# Altium footprint library mastermind.PCBLIB: 1061 footprints (part 64 of 67)
Each footprint in its own frame and in the unit in brackets; x right, y up, seen from the top. Pads: shape width x height; smd on the part's side, far side on the other; paste and mask are expansions set on the pad; w line width, h text height; cw(c..) or ccw(c..) is an arc to the next point about the centre after c.
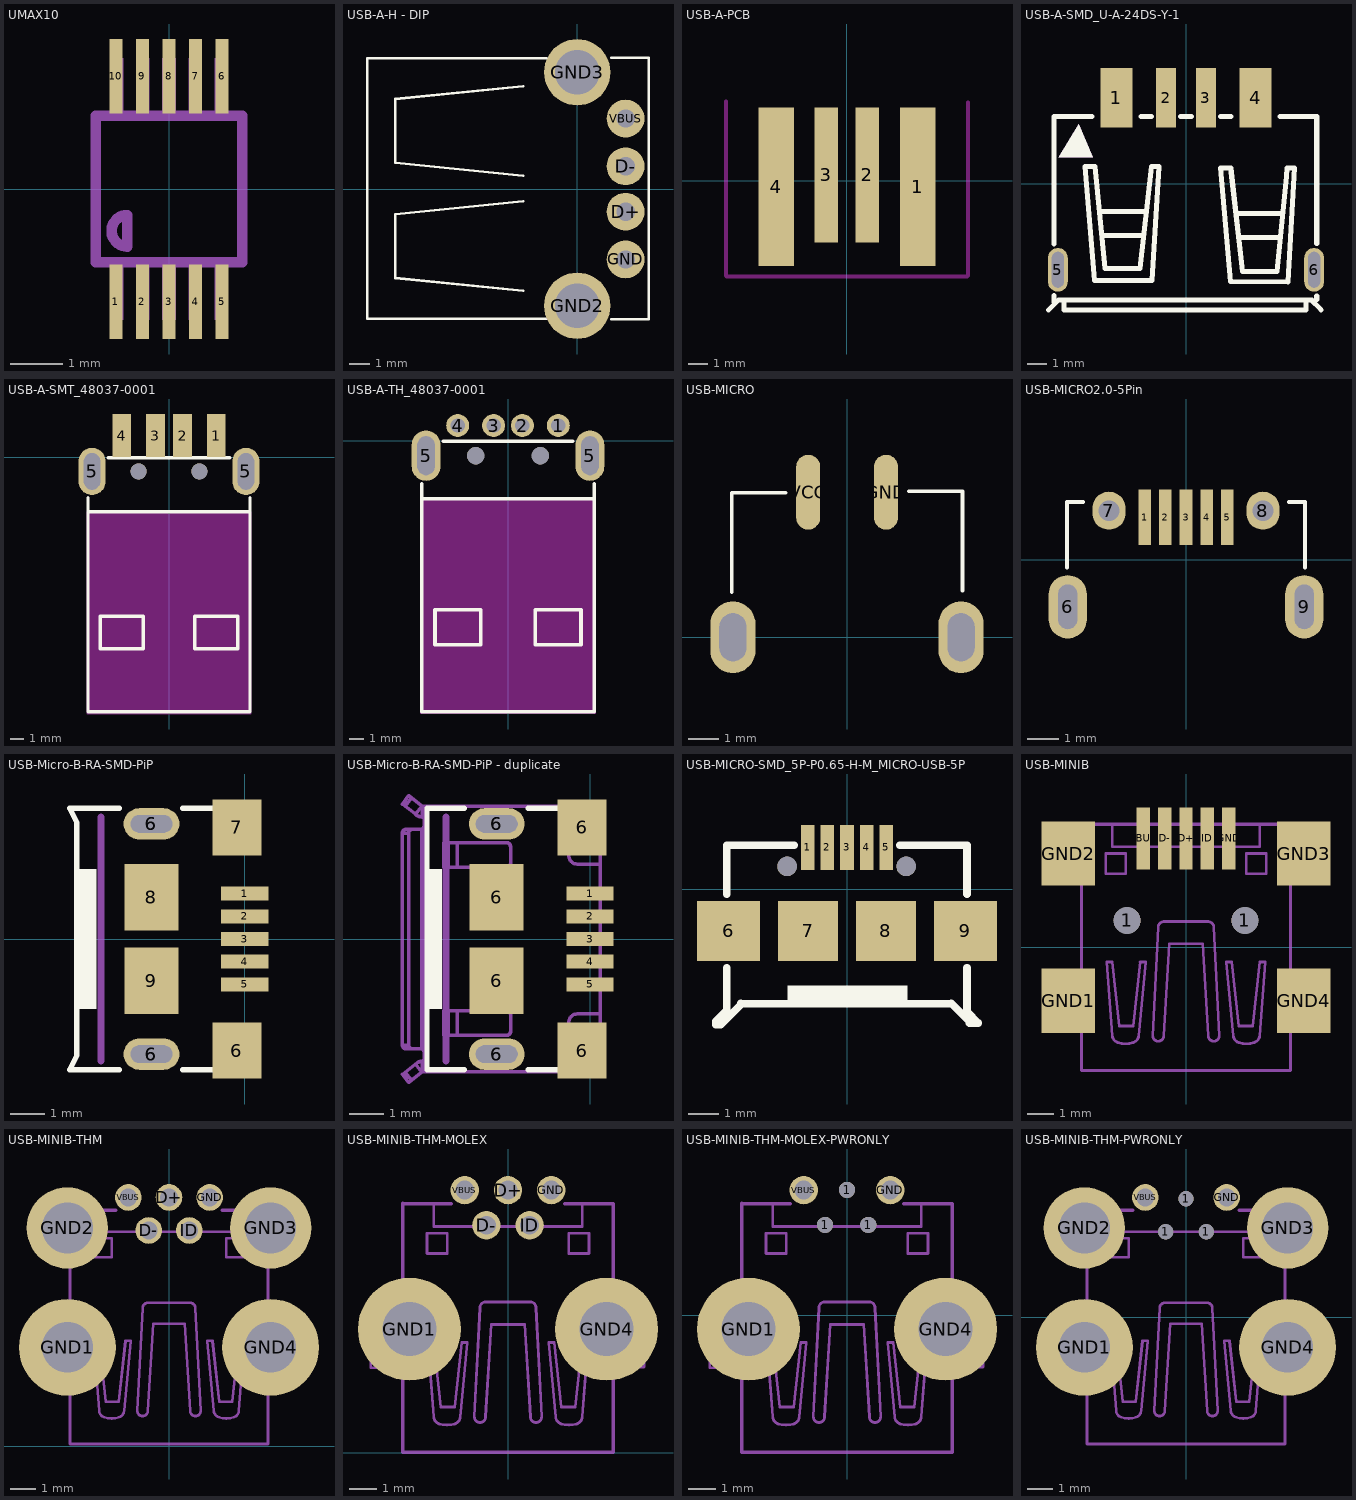
[diagram p63: the footprints below, top view; thin cyan lines are the x and y axes]

## UMAX10 [mil]
pads (10):
  rect 10x56 smd: 1(-40,-85) 2(-20,-85) 3(0,-85) 4(20,-85) 5(40,-85) 6(40,85) 7(20,85) 8(0,85) 9(-20,85) 10(-40,85)
Mechanical 2:
  lines w8: -55.12,-55.12 -55.12,55.12 55.12,55.12 55.12,-55.12 -55.12,-55.12 ; -31.5,-43.31 cw(c-31.5,-31.5) -31.5,-19.69 -31.5,-43.31
Mechanical 8:
  region: -34.47,98.43 -34.47,59.06 -44.32,59.06 -44.32,98.43
  region: -14.79,98.43 -14.79,59.06 -24.63,59.06 -24.63,98.43
  region: 4.9,98.43 4.9,59.06 -4.94,59.06 -4.94,98.43
  region: 24.58,98.43 24.58,59.06 14.74,59.06 14.74,98.43
  region: 44.27,98.43 44.27,59.06 34.43,59.06 34.43,98.43
  region: 34.47,-98.43 34.47,-59.06 44.32,-59.06 44.32,-98.43
  region: 14.79,-98.43 14.79,-59.06 24.63,-59.06 24.63,-98.43
  region: -4.9,-98.43 -4.9,-59.06 4.94,-59.06 4.94,-98.43
  region: -24.58,-98.43 -24.58,-59.06 -14.74,-59.06 -14.74,-98.43
  region: -44.27,-98.43 -44.27,-59.06 -34.43,-59.06 -34.43,-98.43

## USB-A-H - DIP [mil]
pads (6):
  round 74 hole 36: D+(94.49,-44.37) D-(94.49,44.37) GND(94.49,-137.8) VBUS(94.49,137.8)
  round 129.91 hole 86.61: GND2(0,-228.35) GND3(0,228.35)
Top Overlay:
  lines w5: -106,-199 -356,-174 -356,-49 -106,-24 ; -106,26 -356,51 -356,176 -106,201 ; -60,-254 -411,-254 -411,256 -60,256 ; 66,-255 140,-255 140,257 66,257

## USB-A-PCB [mm]
pads (4):
  rect 1.8x8 smd: 1(3.567,-0.3) 4(-3.567,-0.3)
  rect 1.2x6.8 smd: 2(1.027,0.3) 3(-1.046,0.3)
Keep-Out Layer:
  lines w0.2: -6.108,-4.766 -6.108,3.994 ; -6.068,-4.816 6.047,-4.816 ; 6.097,-4.776 6.097,3.955

## USB-A-SMD_U-A-24DS-Y-1 [mm]
pads (6):
  rect 1.6x3 smd paste-100 mask+0.051: 1(-3.5,4.325) 4(3.5,4.325)
  rect 1x3 smd paste-100 mask+0.051: 2(-1,4.325) 3(1,4.325)
  oval 1x2.2 hole 0.6 slot 1.8 at 90 deg paste-2539.97 mask+0.051: 5(-6.45,-4.325) 6(6.45,-4.325)
Top Overlay:
  region: -5.39,3.01 -6.41,1.34 -4.69,1.33
  lines w0.254: -6.914,-6.343 -6.406,-5.835 ; -6.65,-5.95 -6.65,-5.628 ; -6.65,-3.022 -6.65,3.4 -4.732,3.4 ; -6.35,-5.835 6.35,-5.835 ; -6.152,-5.835 -6.152,-6.343 6.04,-6.343 6.04,-5.835 ; -4.305,-1.39 -2.045,-1.39 ; -4.165,-2.6 -2.135,-2.6 ; -2.268,3.4 -1.732,3.4 ; -0.269,3.4 0.269,3.4 ; 1.732,3.4 2.268,3.4 ; 2.576,-1.489 4.836,-1.489 ; 2.716,-2.699 4.746,-2.699 ; 4.732,3.4 6.58,3.4 6.58,-3.006 ; 6.294,-5.835 6.802,-6.343 ; 6.58,-5.82 6.58,-5.644 ; -5.091,0.875 -4.583,0.875 -4.077,-4.26 -2.327,-4.26 -1.738,0.875 -1.357,0.875 -1.712,-4.865 -4.608,-4.865 -5.091,0.875 ; 1.744,0.809 2.253,0.806 2.763,-3.735 2.838,-4.413 4.588,-4.402 5.062,0.376 5.092,0.806 5.472,0.806 5.124,-4.93 2.239,-4.926 1.744,0.809
Top Paste:
  region: 2.499,2.824 2.499,5.826 4.501,5.826 4.501,2.824
  region: 0.5,2.824 0.5,5.826 1.501,5.826 1.501,2.824
  region: -1.501,2.824 -1.501,5.826 -0.5,5.826 -0.5,2.824
  region: -4.501,2.824 -4.501,5.826 -2.499,5.826 -2.499,2.824
  region: -5.95,-4.925 -5.95,-5.024 -6.026,-5.208 -6.167,-5.349 -6.351,-5.425 -6.549,-5.425 -6.733,-5.349 -6.874,-5.208 -6.95,-5.024 -6.95,-4.925 -6.95,-3.725 -6.95,-3.626 -6.874,-3.442 -6.733,-3.301 -6.549,-3.225 -6.351,-3.225 -6.167,-3.301 -6.026,-3.442 -5.95,-3.626 -5.95,-3.725
  region: 6.95,-4.925 6.95,-5.024 6.874,-5.208 6.733,-5.349 6.55,-5.425 6.351,-5.425 6.167,-5.349 6.026,-5.208 5.95,-5.024 5.95,-4.925 5.95,-3.725 5.95,-3.626 6.026,-3.442 6.167,-3.301 6.351,-3.225 6.55,-3.225 6.733,-3.301 6.874,-3.442 6.95,-3.626 6.95,-3.725
Mechanical 15:
  region: -5.39,3.01 -6.41,1.34 -4.69,1.33
3D body "Unnamed-PCBModel.step": height 6.4, standoff -2.3, extent -6.642,-7.175 6.459,4.325

## USB-A-SMT_48037-0001 [mm]
pads (8):
  rect 1.4x3.2 smd: 1(3.5,1.6) 2(1,1.6) 3(-1,1.6) 4(-3.5,1.6)
  oval 2x3.5 hole 1.2 slot 2.7 at 90 deg: 5(-5.7,-1.05) 5(5.7,-1.05)
  round 1.2 hole 1.2 unplated: ""(-2.25,-1.05) ""(2.25,-1.05)
Top Overlay:
  lines w0.254: -6,-4.05 6,-4.05 ; -6,-2.994 -6,-18.85 6,-18.85 6,-2.994 ; -4.495,-0.05 4.495,-0.05 ; -5.08,-14.19 -5.08,-11.777 -1.905,-11.777 -1.905,-14.19 -5.08,-14.19 ; 1.905,-14.19 1.905,-11.777 5.08,-11.777 5.08,-14.19 1.905,-14.19
Keep-Out Layer:
  board cut-out: -6.096,-4.03 6.096,-4.03 6.096,-19.016 -6.096,-19.016
3D body "USB Connector Type A male, SMT.STEP": height 4.45, standoff -2.55, extent -6.214,-19.016 6.214,2.486

## USB-A-TH_48037-0001 [mm]
pads (8):
  round 1.6 hole 1: 1(3.5,1.05) 2(1,1.05) 3(-1,1.05) 4(-3.5,1.05)
  oval 2x3.5 hole 1.2 slot 2.7 at 90 deg: 5(-5.7,-1.05) 5(5.7,-1.05)
  round 1.2 hole 1.2 unplated: ""(-2.25,-1.05) ""(2.25,-1.05)
Top Overlay:
  lines w0.254: -6,-4.05 6,-4.05 ; -6,-2.994 -6,-18.85 6,-18.85 6,-2.994 ; -4.495,-0.05 4.495,-0.05 ; -5.08,-14.19 -1.905,-14.19 -1.905,-11.777 -5.08,-11.777 -5.08,-14.19 ; 1.905,-14.19 5.08,-14.19 5.08,-11.777 1.905,-11.777 1.905,-14.19
Keep-Out Layer:
  board cut-out: -6.096,-4.03 6.096,-4.03 6.096,-19.016 -6.096,-19.016
3D body "usbA.stp": height 4.5, standoff -1.39, extent -6.37,-19.02 6.33,1.18

## USB-MICRO [mm]
pads (4):
  oval 0.8x2.5 smd: GND(1.3,4.84) VCC(-1.3,4.84)
  oval 1.5x2.4 hole 0.9 slot 1.6 at 90 deg: ""(-3.81,0) ""(3.8,0)
Top Overlay:
  lines w0.12: -3.85,1.5 -3.85,4.825 -2.05,4.825 ; 2.05,4.875 3.85,4.875 3.85,1.55

## USB-MICRO2.0-5Pin [mm]
pads (9):
  rect 0.4x1.75 smd: 1(-1.3,1.337) 2(-0.65,1.337) 3(0,1.337) 4(0.65,1.337) 5(1.3,1.337)
  oval 1.2x2 hole 0.6 slot 1.4 at 90 deg: 6(-3.725,-1.488) 9(3.725,-1.488)
  oval 1.05x1.2 hole 0.65: 7(-2.426,1.542) 8(2.425,1.542)
Top Overlay:
  lines w0.127: -3.75,-0.254 -3.75,1.812 -3.25,1.812 ; 3.25,1.812 3.75,1.812 3.75,-0.254
3D body "micro_usb_connector.stp": height 2.6, standoff -0.8, extent -3.891,-3.874 3.881,1.969

## USB-Micro-B-RA-SMD-PiP [mm]
pads (13):
  rect 1.35x0.4 smd: 1(0,1.3) 2(0,0.65) 3(0,0) 4(0,-0.65) 5(0,-1.3)
  oval 1.6x0.9 hole 0.5 slot 1.2 at 0 deg: 6(-2.675,-3.3) 6(-2.675,3.3)
  oval 2x1.5 on Top Paste: 6(-2.675,-3.3) 6(-2.675,3.3)
  rect 1.4x1.6 smd: 6(-0.225,-3.2) 7(-0.225,3.2)
  rect 1.55x1.9 smd: 8(-2.675,1.2) 9(-2.675,-1.2)
Top Overlay:
  rectangle: -4.75,-2 -4.25,2
  lines w0.152: -3.6,-3.75 -5.021,-3.75 -4.814,-3.329 -4.814,3.329 -5.021,3.75 -3.6,3.75 ; -1.775,-3.75 0.25,-3.75 0.25,-3.275 ; -1.775,3.75 0.25,3.75 0.25,3.275
Mechanical 15:
  lines w0.2: -4.125,-3.5 -4.125,3.5
3D body "User Library-MicroUSB-B_Molex_105017-0001.step": height 2.72, standoff -0.59, extent -5.28,-4.1 0.15,4.1

## USB-Micro-B-RA-SMD-PiP - duplicate [mm] "Micro USB B SMT"
height 3
pads (13):
  rect 1.35x0.4 smd: 1(0,1.3) 2(0,0.65) 3(0,0) 4(0,-0.65) 5(0,-1.3)
  oval 1.6x0.9 hole 0.5 slot 1.2 at 0 deg: 6(-2.675,-3.3) 6(-2.675,3.3)
  oval 2x1.5 on Top Paste: 6(-2.675,-3.3) 6(-2.675,3.3)
  rect 1.55x1.9 smd: 6(-2.675,-1.2) 6(-2.675,1.2)
  rect 1.4x1.6 smd: 6(-0.225,-3.2) 6(-0.225,3.2)
Top Overlay:
  rectangle: -4.75,-2 -4.25,2
  lines w0.152: -3.6,-3.75 -4.675,-3.75 -4.675,3.75 -3.6,3.75 ; -1.775,-3.75 0.25,-3.75 0.25,-3.275 ; -1.775,3.75 0.25,3.75 0.25,3.275
Dimensions:
  drawing of 2738 lines, arcs and shapes, not listed
  text ".Designator" at -2.616,-0.297 h0.38
Mechanical 15:
  lines w0.2: -4.125,-3.5 -4.125,3.5
3D body "User Library-MicroUSB-B_Molex_105017-0001.step": height 2.72, standoff -0.59, extent -5.28,-4.1 0.15,4.1

## USB-MICRO-SMD_5P-P0.65-H-M_MICRO-USB-5P [mm]
pads (11):
  rect 0.45x1.5 smd: 1(-1.3,1.392) 2(-0.65,1.392) 3(0,1.392) 4(0.65,1.392) 5(1.3,1.392)
  rect 2.1x2 smd: 6(-3.95,-1.392) 9(3.95,-1.392)
  rect 2x2 smd: 7(-1.3,-1.392) 8(1.3,-1.392)
  round 0.65 hole 0.65 unplated mask+0: ""(-1.995,0.756)
  round 0.65 hole 0.65 unplated paste-2539.97 mask+0: ""(1.974,0.756)
Top Overlay:
  region: 2.016,-3.718 2.016,-3.218 -1.984,-3.218 -1.984,-3.718
  lines w0.254: -4.011,-2.624 -4.011,-4.044 -4.369,-4.402 -4.369,-4.514 -4.204,-4.514 -3.54,-3.85 -3.54,-3.803 ; -4.011,-0.161 -4.011,1.468 ; -4,1.458 -1.757,1.458 ; -3.54,-3.82 3.475,-3.82 ; 1.757,1.458 4,1.458 4,-0.161 ; 3.475,-3.803 4.084,-4.412 4.084,-4.463 4.376,-4.463 4,-4.087 4,-4.044 4,-2.624
3D body "micro USB.STEP": height 2.93, standoff 0.01, extent -4.011,-3.958 3.963,1.468

## USB-MINIB [mm]
pads (11):
  round 1 hole 1: 1(-2.2,1) 1(2.2,1)
  rect 0.5x2.308 smd: D+(0,4.064) D-(-0.8,4.064) GND(1.6,4.064) ID(0.8,4.064) VBUS(-1.6,4.064)
  rect 2x2.4 smd: GND1(-4.4,-2) GND2(-4.4,3.5) GND3(4.4,3.5) GND4(4.4,-2)
Mechanical 2:
  lines w0.127: -3.9,-4.6 3.9,-4.6 ; -3.9,-0.6 -3.9,2.1 ; -3.9,4.6 3.9,4.6 ; -3.2,4.6 -2.1,4.6 ; 2.1,4.6 3.2,4.6 ; 3.9,-0.6 3.9,2.1
Mechanical 8:
  lines w0.102: -5.08,-2.67 -5.08,-2.32 ccw(c-5.08,-2.02) -5.08,-1.72 -5.08,-1.32 ; -5.08,2.87 -5.08,3.22 ccw(c-5.08,3.52) -5.08,3.82 -5.08,4.22 ; -5.06,-2.679 -3.91,-2.679 ; -5.06,-1.301 -3.91,-1.301 ; -5.06,2.861 -3.91,2.861 ; -5.06,4.239 -3.91,4.239 ; -2.75,4.5 -2.75,3.75 2.75,3.75 2.75,4.5 ; -1.038,-3.506 cw(c-1.038,-3.299) -1.246,-3.298 -1.038,0.751 cw(c-0.819,0.739) -0.831,0.958 0.83,0.958 cw(c0.818,0.739) 1.038,0.751 1.246,-3.298 cw(c1.038,-3.299) 1.038,-3.506 cw(c1.038,-3.298) 0.83,-3.298 0.623,0.128 -0.623,0.128 -0.831,-3.298 cw(c-1.038,-3.299) -1.038,-3.506 ; 3.88,-2.659 5.03,-2.659 ; 3.88,-1.281 5.03,-1.281 ; 3.88,2.881 5.03,2.881 ; 3.88,4.259 5.03,4.259 ; 5.05,-2.64 5.05,-2.24 cw(c5.05,-1.94) 5.05,-1.64 5.05,-1.29 ; 5.05,2.9 5.05,3.3 cw(c5.05,3.6) 5.05,3.9 5.05,4.25 ; -3,2.75 -2.25,2.75 -2.25,3.5 -3,3.5 -3,2.75 ; -2.959,-0.547 -2.751,-3.298 ccw(c-2.457,-3.276) -2.544,-3.558 ccw(c-2.258,-2.627) -1.973,-3.558 ccw(c-2.059,-3.276) -1.765,-3.298 -1.505,-0.547 -1.713,-0.547 -1.973,-2.935 -2.492,-2.935 -2.751,-0.547 -2.959,-0.547 ; 1.505,-0.547 1.765,-3.298 ccw(c2.059,-3.276) 1.973,-3.558 ccw(c2.258,-2.627) 2.544,-3.558 ccw(c2.457,-3.276) 2.751,-3.298 2.959,-0.547 2.751,-0.547 2.492,-2.935 1.973,-2.935 1.713,-0.547 1.505,-0.547 ; 2.25,2.75 2.25,3.5 3,3.5 3,2.75 2.25,2.75
  lines w0.127: -3.9,-4.6 -3.9,-2.7 ; -3.9,-1.29 -3.9,2.81 ; -3.9,4.25 -3.9,4.6 ; 3.9,-4.6 3.9,-2.7 ; 3.9,-1.24 3.9,2.86 ; 3.9,4.3 3.9,4.6

## USB-MINIB-THM [mm]
pads (9):
  round 1.05 hole 0.7: D+(0,9.8) D-(-0.8,8.5) GND(1.6,9.8) ID(0.8,8.5) VBUS(-1.6,9.8)
  round 3.81 hole 2: GND1(-4,3.9) GND4(4,3.9)
  round 3.2 hole 2: GND2(-4,8.6) GND3(4,8.6)
Mechanical 2:
  lines w0.102: -1.038,1.194 -1.038,1.194
  lines w0.127: -3.9,0.1 3.9,0.1 ; -3.9,4.1 -3.9,6.8 ; -3.2,9.3 -2.1,9.3 ; 2.1,9.3 3.2,9.3 ; 3.9,4.7 3.9,6.8
Mechanical 8:
  lines w0.102: -5.08,3.23 -5.08,3.58 ccw(c-5.08,3.88) -5.08,4.18 -5.08,4.58 ; -5.08,7.57 -5.08,7.92 ccw(c-5.08,8.22) -5.08,8.52 -5.08,8.92 ; -5.06,3.221 -3.91,3.221 ; -5.06,4.599 -3.91,4.599 ; -5.06,7.561 -3.91,7.561 ; -5.06,8.939 -3.91,8.939 ; -2.75,9.2 -2.75,8.45 2.75,8.45 2.75,9.2 ; -1.038,1.194 cw(c-1.038,1.401) -1.246,1.402 -1.038,5.451 cw(c-0.819,5.439) -0.831,5.658 0.83,5.658 cw(c0.818,5.439) 1.038,5.451 1.246,1.402 cw(c1.038,1.401) 1.038,1.194 cw(c1.038,1.402) 0.83,1.402 0.623,4.828 -0.623,4.828 -0.831,1.402 cw(c-1.038,1.401) -1.038,1.194 ; 3.88,3.241 5.03,3.241 ; 3.88,4.619 5.03,4.619 ; 3.88,7.581 5.03,7.581 ; 3.88,8.959 5.03,8.959 ; 5.05,3.26 5.05,3.66 cw(c5.05,3.96) 5.05,4.26 5.05,4.61 ; 5.05,7.6 5.05,8 cw(c5.05,8.3) 5.05,8.6 5.05,8.95 ; -3,7.45 -2.25,7.45 -2.25,8.2 -3,8.2 -3,7.45 ; -2.959,4.153 -2.751,1.402 ccw(c-2.457,1.424) -2.544,1.142 ccw(c-2.258,2.073) -1.973,1.142 ccw(c-2.059,1.424) -1.765,1.402 -1.505,4.153 -1.713,4.153 -1.973,1.765 -2.492,1.765 -2.751,4.153 -2.959,4.153 ; 1.505,4.153 1.765,1.402 ccw(c2.059,1.424) 1.973,1.142 ccw(c2.258,2.073) 2.544,1.142 ccw(c2.457,1.424) 2.751,1.402 2.959,4.153 2.751,4.153 2.492,1.765 1.973,1.765 1.713,4.153 1.505,4.153 ; 2.25,7.45 2.25,8.2 3,8.2 3,7.45 2.25,7.45
  lines w0.127: -3.9,0.1 -3.9,3.2 ; -3.9,4.61 -3.9,7.51 ; -3.9,8.95 -3.9,9.3 ; 3.9,0.1 3.9,3.2 ; 3.9,4.66 3.9,7.56 ; 3.9,9 3.9,9.3

## USB-MINIB-THM-MOLEX [mil]
pads (7):
  round 41.34 hole 27.56: D+(0,382.68) D-(-31.5,331.5) GND(62.99,382.68) ID(31.5,331.5) VBUS(-62.99,382.68)
  round 150 hole 78.74: GND1(-143.7,179.92) GND4(143.7,179.92)
Mechanical 2:
  lines w4: -40.88,43.85 -40.87,43.85
  lines w5: -153.54,0.79 153.54,0.79 ; -153.54,158.27 -153.54,264.57 ; -153.54,362.99 -82.68,362.99 ; 82.68,362.99 153.54,362.99 ; 153.54,181.89 153.54,264.57
Mechanical 8:
  lines w4: -200,124.02 -200,137.8 ccw(c-200,149.61) -200,161.42 -200,177.17 ; -199.21,123.65 -153.94,123.65 ; -199.21,177.92 -153.94,177.92 ; -108.27,359.06 -108.27,329.53 108.27,329.53 108.27,359.06 ; -40.88,43.85 cw(c-40.88,52.02) -49.05,52.03 -40.88,211.45 cw(c-32.23,210.97) -32.7,219.62 32.69,219.62 cw(c32.22,210.97) 40.87,211.45 49.04,52.03 cw(c40.87,52.02) 40.87,43.85 cw(c40.87,52.03) 32.69,52.03 24.52,186.92 -24.54,186.92 -32.7,52.03 cw(c-40.88,52.02) -40.87,43.85 ; 152.76,124.44 198.03,124.44 ; 152.76,178.72 198.03,178.72 ; 198.82,125.2 198.82,140.94 cw(c198.82,152.75) 198.82,164.57 198.82,178.35 ; -118.11,290.16 -118.11,319.69 -88.58,319.69 -88.58,290.16 -118.11,290.16 ; -116.5,160.35 -108.32,160.35 -98.11,66.33 -77.67,66.33 -67.45,160.35 -59.27,160.35 -69.49,52.03 cw(c-81.07,52.91) -77.67,41.81 cw(c-88.91,78.46) -100.15,41.81 cw(c-96.75,52.91) -108.32,52.03 -116.5,160.35 ; 59.26,160.35 67.44,160.35 77.66,66.33 98.1,66.33 108.32,160.35 116.49,160.35 108.32,52.03 cw(c96.74,52.91) 100.14,41.81 cw(c88.9,78.46) 77.66,41.81 cw(c81.06,52.91) 69.48,52.03 59.26,160.35 ; 88.58,290.16 118.11,290.16 118.11,319.69 88.58,319.69 88.58,290.16
  lines w5: -153.54,0.79 -153.54,122.83 ; -153.54,178.35 -153.54,363.39 ; 153.54,0.79 153.54,122.83 ; 153.54,180.32 153.54,361.42

## USB-MINIB-THM-MOLEX-PWRONLY [mil]
pads (7):
  round 23.62 hole 23.62: 1(-32,132) 1(0,183) 1(31,132)
  round 41.34 hole 27.56: GND(62.99,182.68) VBUS(-62.99,182.68)
  round 150 hole 78.74: GND1(-143.7,-20.08) GND4(143.7,-20.08)
Mechanical 2:
  lines w4: -40.88,-156.15 -40.87,-156.15
  lines w5: -153.54,-199.21 153.54,-199.21 ; -153.54,-41.73 -153.54,64.57 ; -153.54,162.99 -82.68,162.99 ; 82.68,162.99 153.54,162.99 ; 153.54,-18.11 153.54,64.57
Mechanical 8:
  lines w4: -200,-75.98 -200,-62.2 ccw(c-200,-50.39) -200,-38.58 -200,-22.83 ; -199.21,-76.35 -153.94,-76.35 ; -199.21,-22.08 -153.94,-22.08 ; -108.27,159.06 -108.27,129.53 108.27,129.53 108.27,159.06 ; -40.88,-156.15 cw(c-40.88,-147.97) -49.05,-147.97 -40.88,11.45 cw(c-32.23,10.97) -32.7,19.62 32.69,19.62 cw(c32.22,10.97) 40.87,11.45 49.04,-147.97 cw(c40.87,-147.97) 40.87,-156.15 cw(c40.87,-147.97) 32.69,-147.97 24.52,-13.08 -24.54,-13.08 -32.7,-147.97 cw(c-40.88,-147.97) -40.87,-156.15 ; 152.76,-75.56 198.03,-75.56 ; 152.76,-21.28 198.03,-21.28 ; 198.82,-74.8 198.82,-59.06 cw(c198.82,-47.24) 198.82,-35.43 198.82,-21.65 ; -118.11,90.16 -88.58,90.16 -88.58,119.69 -118.11,119.69 -118.11,90.16 ; -116.5,-39.65 -108.32,-147.97 ccw(c-96.75,-147.09) -100.15,-158.19 ccw(c-88.91,-121.54) -77.67,-158.19 ccw(c-81.07,-147.09) -69.49,-147.97 -59.27,-39.65 -67.45,-39.65 -77.67,-133.67 -98.11,-133.67 -108.32,-39.65 -116.5,-39.65 ; 59.26,-39.65 69.48,-147.97 ccw(c81.06,-147.09) 77.66,-158.19 ccw(c88.9,-121.54) 100.14,-158.19 ccw(c96.74,-147.09) 108.32,-147.97 116.49,-39.65 108.32,-39.65 98.1,-133.67 77.66,-133.67 67.44,-39.65 59.26,-39.65 ; 88.58,90.16 88.58,119.69 118.11,119.69 118.11,90.16 88.58,90.16
  lines w5: -153.54,-199.21 -153.54,-77.17 ; -153.54,-21.65 -153.54,163.39 ; 153.54,-199.21 153.54,-77.17 ; 153.54,-19.69 153.54,161.42

## USB-MINIB-THM-PWRONLY [mm]
pads (9):
  round 0.6 hole 0.6: 1(-0.8,3.37) 1(0,4.67) 1(0.8,3.37)
  round 1.05 hole 0.7: GND(1.6,4.72) VBUS(-1.6,4.72)
  round 3.81 hole 2: GND1(-4,-1.18) GND4(4,-1.18)
  round 3.2 hole 2: GND2(-4,3.52) GND3(4,3.52)
Mechanical 2:
  lines w0.102: -1.038,-3.886 -1.038,-3.886
  lines w0.127: -3.9,-4.98 3.9,-4.98 ; -3.9,-0.98 -3.9,1.72 ; -3.2,4.22 -2.1,4.22 ; 2.1,4.22 3.2,4.22 ; 3.9,-0.38 3.9,1.72
Mechanical 8:
  lines w0.102: -5.08,-1.85 -5.08,-1.5 ccw(c-5.08,-1.2) -5.08,-0.9 -5.08,-0.5 ; -5.08,2.49 -5.08,2.84 ccw(c-5.08,3.14) -5.08,3.44 -5.08,3.84 ; -5.06,-1.859 -3.91,-1.859 ; -5.06,-0.481 -3.91,-0.481 ; -5.06,2.481 -3.91,2.481 ; -5.06,3.859 -3.91,3.859 ; -2.75,4.12 -2.75,3.37 2.75,3.37 2.75,4.12 ; -1.038,-3.886 cw(c-1.038,-3.679) -1.246,-3.678 -1.038,0.371 cw(c-0.819,0.359) -0.831,0.578 0.83,0.578 cw(c0.818,0.359) 1.038,0.371 1.246,-3.678 cw(c1.038,-3.679) 1.038,-3.886 cw(c1.038,-3.678) 0.83,-3.678 0.623,-0.252 -0.623,-0.252 -0.831,-3.678 cw(c-1.038,-3.679) -1.038,-3.886 ; 3.88,-1.839 5.03,-1.839 ; 3.88,-0.461 5.03,-0.461 ; 3.88,2.501 5.03,2.501 ; 3.88,3.879 5.03,3.879 ; 5.05,-1.82 5.05,-1.42 cw(c5.05,-1.12) 5.05,-0.82 5.05,-0.47 ; 5.05,2.52 5.05,2.92 cw(c5.05,3.22) 5.05,3.52 5.05,3.87 ; -3,2.37 -2.25,2.37 -2.25,3.12 -3,3.12 -3,2.37 ; -2.959,-0.927 -2.751,-3.678 ccw(c-2.457,-3.656) -2.544,-3.938 ccw(c-2.258,-3.007) -1.973,-3.938 ccw(c-2.059,-3.656) -1.765,-3.678 -1.505,-0.927 -1.713,-0.927 -1.973,-3.315 -2.492,-3.315 -2.751,-0.927 -2.959,-0.927 ; 1.505,-0.927 1.765,-3.678 ccw(c2.059,-3.656) 1.973,-3.938 ccw(c2.258,-3.007) 2.544,-3.938 ccw(c2.457,-3.656) 2.751,-3.678 2.959,-0.927 2.751,-0.927 2.492,-3.315 1.973,-3.315 1.713,-0.927 1.505,-0.927 ; 2.25,2.37 2.25,3.12 3,3.12 3,2.37 2.25,2.37
  lines w0.127: -3.9,-4.98 -3.9,-1.88 ; -3.9,-0.47 -3.9,2.43 ; -3.9,3.87 -3.9,4.22 ; 3.9,-4.98 3.9,-1.88 ; 3.9,-0.42 3.9,2.48 ; 3.9,3.92 3.9,4.22